# Altium schematic symbol library jlcpcb_2025_04_capacitors_extended_1206.schlib: 2503 symbols (part 12 of 14) (continued)
## LMK316ABJ226KL-T
designator C?  Capacitance: 22uF  (hidden comment: *)
Capacitor, Ceramic (MLCC), 22uF, ±10%, 10V, X5R, ±10%, SMD 1206; Manufacturer: Taiyo Yuden; Manufacturer Part Number: LMK316ABJ226KL-T; Package Size: 1206; JLCPCB Basic Part: No; JLCPCB Part Number: C412630; Supplier 1: LCSC; Category: Capacitors - MLCC; Supplier Part Number 1: C412630; Tolerance: ±10%; Voltage Rating: 10V; Temperature Coefficient: X5R; RoHS: Yes; ComponentLink1Description: Datasheet; ComponentLink1URL: https://wmsc.lcsc.com/wmsc/upload/file/pdf/v2/lcsc/2211282230_Taiyo-Yuden-LMK316ABJ226KL-T_C412630.pdf; ComponentLink2Description: JLCPCB Part URL; ComponentLink2URL: https://jlcpcb.com/partdetail/C412630; ComponentLink3Description: LCSC Part URL; ComponentLink3URL: https://lcsc.com/product-detail/Multilayer-Ceramic-Capacitors-MLCC---SMD-SMT_Taiyo-Yuden-Taiyo-Yuden-LMK316ABJ226KL-T_C412630.html
footprint CAP-1206 (1206 (3216M) Capacitor)
pins: 1, 2

## LMK316ABJ226KLHT
designator C?  Capacitance: 22uF  (hidden comment: *)
Capacitor, Ceramic (MLCC), 22uF, ±10%, 10V, X5R, ±10%, SMD 1206; Manufacturer: Taiyo Yuden; Manufacturer Part Number: LMK316ABJ226KLHT; Package Size: 1206; JLCPCB Basic Part: No; JLCPCB Part Number: C650976; Supplier 1: LCSC; Category: Capacitors - MLCC; Supplier Part Number 1: C650976; Tolerance: ±10%; Voltage Rating: 10V; Temperature Coefficient: X5R; RoHS: Yes; ComponentLink1Description: Datasheet; ComponentLink1URL: https://wmsc.lcsc.com/wmsc/upload/file/pdf/v2/lcsc/2211282200_Taiyo-Yuden-LMK316ABJ226KLHT_C650976.pdf; ComponentLink2Description: JLCPCB Part URL; ComponentLink2URL: https://jlcpcb.com/partdetail/C650976; ComponentLink3Description: LCSC Part URL; ComponentLink3URL: https://lcsc.com/product-detail/Multilayer-Ceramic-Capacitors-MLCC---SMD-SMT_Taiyo-Yuden-Taiyo-Yuden-LMK316ABJ226KLHT_C650976.html
footprint CAP-1206 (1206 (3216M) Capacitor)
pins: 1, 2

## LMK316ABJ226MLHT
designator C?  Capacitance: 22uF  (hidden comment: *)
Capacitor, Ceramic (MLCC), 22uF, ±20%, 10V, X5R, ±20%, SMD 1206; Manufacturer: Taiyo Yuden; Manufacturer Part Number: LMK316ABJ226MLHT; Package Size: 1206; JLCPCB Basic Part: No; JLCPCB Part Number: C651003; Supplier 1: LCSC; Category: Capacitors - MLCC; Supplier Part Number 1: C651003; Tolerance: ±20%; Voltage Rating: 10V; Temperature Coefficient: X5R; RoHS: Yes; ComponentLink1Description: Datasheet; ComponentLink1URL: https://wmsc.lcsc.com/wmsc/upload/file/pdf/v2/lcsc/2304140030_Taiyo-Yuden-LMK316ABJ226MLHT_C651003.pdf; ComponentLink2Description: JLCPCB Part URL; ComponentLink2URL: https://jlcpcb.com/partdetail/C651003; ComponentLink3Description: LCSC Part URL; ComponentLink3URL: https://lcsc.com/product-detail/Multilayer-Ceramic-Capacitors-MLCC---SMD-SMT_Taiyo-Yuden-Taiyo-Yuden-LMK316ABJ226MLHT_C651003.html
footprint CAP-1206 (1206 (3216M) Capacitor)
pins: 1, 2

## LMK316ABJ476ML-T
designator C?  Capacitance: 47uF  (hidden comment: *)
Capacitor, Ceramic (MLCC), 47uF, ±20%, 10V, X5R, ±20%, SMD 1206; Manufacturer: Taiyo Yuden; Manufacturer Part Number: LMK316ABJ476ML-T; Package Size: 1206; JLCPCB Basic Part: No; JLCPCB Part Number: C268024; Supplier 1: LCSC; Category: Capacitors - MLCC; Supplier Part Number 1: C268024; Tolerance: ±20%; Voltage Rating: 10V; Temperature Coefficient: X5R; RoHS: Yes; ComponentLink1Description: Datasheet; ComponentLink1URL: https://wmsc.lcsc.com/wmsc/upload/file/pdf/v2/lcsc/2211282230_Taiyo-Yuden-LMK316ABJ476ML-T_C268024.pdf; ComponentLink2Description: JLCPCB Part URL; ComponentLink2URL: https://jlcpcb.com/partdetail/C268024; ComponentLink3Description: LCSC Part URL; ComponentLink3URL: https://lcsc.com/product-detail/Multilayer-Ceramic-Capacitors-MLCC---SMD-SMT_Taiyo-Yuden-Taiyo-Yuden-LMK316ABJ476ML-T_C268024.html
footprint CAP-1206 (1206 (3216M) Capacitor)
pins: 1, 2

## LMK316B7226KL-TR
designator C?  Capacitance: 22uF  (hidden comment: *)
Capacitor, Ceramic (MLCC), 22uF, ±10%, 10V, X7R, ±10%, SMD 1206; Manufacturer: Taiyo Yuden; Manufacturer Part Number: LMK316B7226KL-TR; Package Size: 1206; JLCPCB Basic Part: No; JLCPCB Part Number: C555367; Supplier 1: LCSC; Category: Capacitors - MLCC; Supplier Part Number 1: C555367; Tolerance: ±10%; Voltage Rating: 10V; Temperature Coefficient: X7R; RoHS: Yes; ComponentLink1Description: Datasheet; ComponentLink1URL: https://wmsc.lcsc.com/wmsc/upload/file/pdf/v2/lcsc/2304140030_Taiyo-Yuden-LMK316B7226KL-TR_C555367.pdf; ComponentLink2Description: JLCPCB Part URL; ComponentLink2URL: https://jlcpcb.com/partdetail/C555367; ComponentLink3Description: LCSC Part URL; ComponentLink3URL: https://lcsc.com/product-detail/Multilayer-Ceramic-Capacitors-MLCC---SMD-SMT_Taiyo-Yuden-Taiyo-Yuden-LMK316B7226KL-TR_C555367.html
footprint CAP-1206 (1206 (3216M) Capacitor)
pins: 1, 2

## LMK316B7475KL-T
designator C?  Capacitance: 4.7uF  (hidden comment: *)
Capacitor, Ceramic (MLCC), 4.7uF, ±10%, 10V, X7R, ±10%, SMD 1206; Manufacturer: Taiyo Yuden; Manufacturer Part Number: LMK316B7475KL-T; Package Size: 1206; JLCPCB Basic Part: No; JLCPCB Part Number: C311694; Supplier 1: LCSC; Category: Capacitors - MLCC; Supplier Part Number 1: C311694; Tolerance: ±10%; Voltage Rating: 10V; Temperature Coefficient: X7R; RoHS: Yes; ComponentLink1Description: Datasheet; ComponentLink1URL: https://wmsc.lcsc.com/wmsc/upload/file/pdf/v2/lcsc/2211282230_Taiyo-Yuden-LMK316B7475KL-T_C311694.pdf; ComponentLink2Description: JLCPCB Part URL; ComponentLink2URL: https://jlcpcb.com/partdetail/C311694; ComponentLink3Description: LCSC Part URL; ComponentLink3URL: https://lcsc.com/product-detail/Multilayer-Ceramic-Capacitors-MLCC---SMD-SMT_Taiyo-Yuden-Taiyo-Yuden-LMK316B7475KL-T_C311694.html
footprint CAP-1206 (1206 (3216M) Capacitor)
pins: 1, 2

## LMK316BC6476ML-T
designator C?  Capacitance: 47uF  (hidden comment: *)
Capacitor, Ceramic (MLCC), 47uF, ±20%, 10V, X6S, ±20%, SMD 1206; Manufacturer: Taiyo Yuden; Manufacturer Part Number: LMK316BC6476ML-T; Package Size: 1206; JLCPCB Basic Part: No; JLCPCB Part Number: C2176999; Supplier 1: LCSC; Category: Capacitors - MLCC; Supplier Part Number 1: C2176999; Tolerance: ±20%; Voltage Rating: 10V; Temperature Coefficient: X6S; RoHS: Yes; ComponentLink1Description: Datasheet; ComponentLink1URL: https://wmsc.lcsc.com/wmsc/upload/file/pdf/v2/lcsc/2309051423_Taiyo-Yuden-LMK316BC6476ML-T_C2176999.pdf; ComponentLink2Description: JLCPCB Part URL; ComponentLink2URL: https://jlcpcb.com/partdetail/C2176999; ComponentLink3Description: LCSC Part URL; ComponentLink3URL: https://lcsc.com/product-detail/Multilayer-Ceramic-Capacitors-MLCC---SMD-SMT_Taiyo-Yuden-Taiyo-Yuden-LMK316BC6476ML-T_C2176999.html
footprint CAP-1206 (1206 (3216M) Capacitor)
pins: 1, 2

## LMK316BJ226KL-T
designator C?  Capacitance: 22uF  (hidden comment: *)
Capacitor, Ceramic (MLCC), 22uF, ±10%, 10V, X5R, ±10%, SMD 1206; Manufacturer: Taiyo Yuden; Manufacturer Part Number: LMK316BJ226KL-T; Package Size: 1206; JLCPCB Basic Part: No; JLCPCB Part Number: C92818; Supplier 1: LCSC; Category: Capacitors - MLCC; Supplier Part Number 1: C92818; Tolerance: ±10%; Voltage Rating: 10V; Temperature Coefficient: X5R; RoHS: Yes; ComponentLink1Description: Datasheet; ComponentLink1URL: https://wmsc.lcsc.com/wmsc/upload/file/pdf/v2/lcsc/2211282300_Taiyo-Yuden-LMK316BJ226KL-T_C92818.pdf; ComponentLink2Description: JLCPCB Part URL; ComponentLink2URL: https://jlcpcb.com/partdetail/C92818; ComponentLink3Description: LCSC Part URL; ComponentLink3URL: https://lcsc.com/product-detail/Multilayer-Ceramic-Capacitors-MLCC---SMD-SMT_Taiyo-Yuden-Taiyo-Yuden-LMK316BJ226KL-T_C92818.html
footprint CAP-1206 (1206 (3216M) Capacitor)
pins: 1, 2

## LMK316BJ226ML-T
designator C?  Capacitance: 22uF  (hidden comment: *)
Capacitor, Ceramic (MLCC), 22uF, ±20%, 10V, X5R, ±20%, SMD 1206; Manufacturer: Taiyo Yuden; Manufacturer Part Number: LMK316BJ226ML-T; Package Size: 1206; JLCPCB Basic Part: No; JLCPCB Part Number: C92819; Supplier 1: LCSC; Category: Capacitors - MLCC; Supplier Part Number 1: C92819; Tolerance: ±20%; Voltage Rating: 10V; Temperature Coefficient: X5R; RoHS: Yes; ComponentLink1Description: Datasheet; ComponentLink1URL: https://wmsc.lcsc.com/wmsc/upload/file/pdf/v2/lcsc/1912111437_Taiyo-Yuden-LMK316BJ226ML-T_C92819.pdf; ComponentLink2Description: JLCPCB Part URL; ComponentLink2URL: https://jlcpcb.com/partdetail/C92819; ComponentLink3Description: LCSC Part URL; ComponentLink3URL: https://lcsc.com/product-detail/Multilayer-Ceramic-Capacitors-MLCC---SMD-SMT_Taiyo-Yuden-Taiyo-Yuden-LMK316BJ226ML-T_C92819.html
footprint CAP-1206 (1206 (3216M) Capacitor)
pins: 1, 2

## LMK316BJ475KL-T
designator C?  Capacitance: 4.7uF  (hidden comment: *)
Capacitor, Ceramic (MLCC), 4.7uF, ±10%, 10V, X5R, ±10%, SMD 1206; Manufacturer: Taiyo Yuden; Manufacturer Part Number: LMK316BJ475KL-T; Package Size: 1206; JLCPCB Basic Part: No; JLCPCB Part Number: C89145; Supplier 1: LCSC; Category: Capacitors - MLCC; Supplier Part Number 1: C89145; Tolerance: ±10%; Voltage Rating: 10V; Temperature Coefficient: X5R; RoHS: Yes; ComponentLink1Description: Datasheet; ComponentLink1URL: https://wmsc.lcsc.com/wmsc/upload/file/pdf/v2/lcsc/2211282300_Taiyo-Yuden-LMK316BJ475KL-T_C89145.pdf; ComponentLink2Description: JLCPCB Part URL; ComponentLink2URL: https://jlcpcb.com/partdetail/C89145; ComponentLink3Description: LCSC Part URL; ComponentLink3URL: https://lcsc.com/product-detail/Multilayer-Ceramic-Capacitors-MLCC---SMD-SMT_Taiyo-Yuden-Taiyo-Yuden-LMK316BJ475KL-T_C89145.html
footprint CAP-1206 (1206 (3216M) Capacitor)
pins: 1, 2

## LMK316BJ475ML-T
designator C?  Capacitance: 4.7uF  (hidden comment: *)
Capacitor, Ceramic (MLCC), 4.7uF, ±20%, 10V, X5R, ±20%, SMD 1206; Manufacturer: Taiyo Yuden; Manufacturer Part Number: LMK316BJ475ML-T; Package Size: 1206; JLCPCB Basic Part: No; JLCPCB Part Number: C92820; Supplier 1: LCSC; Category: Capacitors - MLCC; Supplier Part Number 1: C92820; Tolerance: ±20%; Voltage Rating: 10V; Temperature Coefficient: X5R; RoHS: Yes; ComponentLink1Description: Datasheet; ComponentLink1URL: https://wmsc.lcsc.com/wmsc/upload/file/pdf/v2/lcsc/2211282300_Taiyo-Yuden-LMK316BJ475ML-T_C92820.pdf; ComponentLink2Description: JLCPCB Part URL; ComponentLink2URL: https://jlcpcb.com/partdetail/C92820; ComponentLink3Description: LCSC Part URL; ComponentLink3URL: https://lcsc.com/product-detail/Multilayer-Ceramic-Capacitors-MLCC---SMD-SMT_Taiyo-Yuden-Taiyo-Yuden-LMK316BJ475ML-T_C92820.html
footprint CAP-1206 (1206 (3216M) Capacitor)
pins: 1, 2

## LMK316BJ476ML-T
designator C?  Capacitance: 47uF  (hidden comment: *)
Capacitor, Ceramic (MLCC), 47uF, ±20%, 10V, X5R, ±20%, SMD 1206; Manufacturer: Taiyo Yuden; Manufacturer Part Number: LMK316BJ476ML-T; Package Size: 1206; JLCPCB Basic Part: No; JLCPCB Part Number: C92821; Supplier 1: LCSC; Category: Capacitors - MLCC; Supplier Part Number 1: C92821; Tolerance: ±20%; Voltage Rating: 10V; Temperature Coefficient: X5R; RoHS: Yes; ComponentLink1Description: Datasheet; ComponentLink1URL: https://wmsc.lcsc.com/wmsc/upload/file/pdf/v2/lcsc/2211282300_Taiyo-Yuden-LMK316BJ476ML-T_C92821.pdf; ComponentLink2Description: JLCPCB Part URL; ComponentLink2URL: https://jlcpcb.com/partdetail/C92821; ComponentLink3Description: LCSC Part URL; ComponentLink3URL: https://lcsc.com/product-detail/Multilayer-Ceramic-Capacitors-MLCC---SMD-SMT_Taiyo-Yuden-Taiyo-Yuden-LMK316BJ476ML-T_C92821.html
footprint CAP-1206 (1206 (3216M) Capacitor)
pins: 1, 2

## MBK1206X7R102K202NT
designator C?  Capacitance: 1nF  (hidden comment: *)
Capacitor, Ceramic (MLCC), 1nF, 2kV, SMD 1206; Manufacturer: FH-BK(Guangdong Fenghua Bangke Elec); Manufacturer Part Number: MBK1206X7R102K202NT; Package Size: 1206; JLCPCB Basic Part: No; JLCPCB Part Number: C2830714; Supplier 1: LCSC; Category: Capacitors - MLCC; Supplier Part Number 1: C2830714; Voltage Rating: 2kV; RoHS: Yes; ComponentLink1Description: Datasheet; ComponentLink2Description: JLCPCB Part URL; ComponentLink2URL: https://jlcpcb.com/partdetail/C2830714; ComponentLink3Description: LCSC Part URL; ComponentLink3URL: https://lcsc.com/product-detail/Multilayer-Ceramic-Capacitors-MLCC---SMD-SMT_FH-BKGuangdong-Fenghua-Bangke-Elec-FH-BKGuangdong-Fenghua-Bangke-Elec-1206B102K202NT_C2830714.html
footprint CAP-1206 (1206 (3216M) Capacitor)
pins: 1, 2

## MCAST31LAB7106KTNA01
designator C?  Capacitance: 10uF  (hidden comment: *)
Capacitor, Ceramic (MLCC), 10uF, ±10%, 25V, X7R, ±10%, SMD 1206; Manufacturer: Taiyo Yuden; Manufacturer Part Number: MCAST31LAB7106KTNA01; Package Size: 1206; JLCPCB Basic Part: No; JLCPCB Part Number: C386089; Supplier 1: LCSC; Category: Capacitors - MLCC; Supplier Part Number 1: C386089; Tolerance: ±10%; Voltage Rating: 25V; Temperature Coefficient: X7R; RoHS: Yes; ComponentLink1Description: Datasheet; ComponentLink1URL: https://wmsc.lcsc.com/wmsc/upload/file/pdf/v2/lcsc/2308231123_Taiyo-Yuden-MCAST31LAB7106KTNA01_C386089.pdf; ComponentLink2Description: JLCPCB Part URL; ComponentLink2URL: https://jlcpcb.com/partdetail/C386089; ComponentLink3Description: LCSC Part URL; ComponentLink3URL: https://lcsc.com/product-detail/Multilayer-Ceramic-Capacitors-MLCC---SMD-SMT_Taiyo-Yuden-Taiyo-Yuden-TMK316AB7106KLHT_C386089.html
footprint CAP-1206 (1206 (3216M) Capacitor)
pins: 1, 2

## MCJCG31LBB7106KTPA01
designator C?  Capacitance: 10uF  (hidden comment: *)
Capacitor, Ceramic (MLCC), 10uF, ±10%, 35V, X7R, ±10%, SMD 1206; Manufacturer: Taiyo Yuden; Manufacturer Part Number: MCJCG31LBB7106KTPA01; Package Size: 1206; JLCPCB Basic Part: No; JLCPCB Part Number: C5767734; Supplier 1: LCSC; Category: Capacitors - MLCC; Supplier Part Number 1: C5767734; Tolerance: ±10%; Voltage Rating: 35V; Temperature Coefficient: X7R; RoHS: Yes; ComponentLink1Description: Datasheet; ComponentLink1URL: https://wmsc.lcsc.com/wmsc/upload/file/pdf/v2/lcsc/2401302210_Taiyo-Yuden-MCJCG31LBB7106KTPA01_C5767734.pdf; ComponentLink2Description: JLCPCB Part URL; ComponentLink2URL: https://jlcpcb.com/partdetail/C5767734; ComponentLink3Description: LCSC Part URL; ComponentLink3URL: https://lcsc.com/product-detail/Multilayer-Ceramic-Capacitors-MLCC---SMD-SMT_Taiyo-Yuden-Taiyo-Yuden-MCJCG31LBB7106KTPA01_C5767734.html
footprint CAP-1206 (1206 (3216M) Capacitor)
pins: 1, 2

## MSASU31LBB5106KTNA01
designator C?  Capacitance: 10uF  (hidden comment: *)
Capacitor, Ceramic (MLCC), 10uF, ±10%, 50V, X5R, ±10%, SMD 1206; Manufacturer: Taiyo Yuden; Manufacturer Part Number: MSASU31LBB5106KTNA01; Package Size: 1206; JLCPCB Basic Part: No; JLCPCB Part Number: C105175; Supplier 1: LCSC; Category: Capacitors - MLCC; Supplier Part Number 1: C105175; Tolerance: ±10%; Voltage Rating: 50V; Temperature Coefficient: X5R; RoHS: Yes; ComponentLink1Description: Datasheet; ComponentLink1URL: https://wmsc.lcsc.com/wmsc/upload/file/pdf/v2/lcsc/2307141635_Taiyo-Yuden-MSASU31LBB5106KTNA01_C105175.pdf; ComponentLink2Description: JLCPCB Part URL; ComponentLink2URL: https://jlcpcb.com/partdetail/C105175; ComponentLink3Description: LCSC Part URL; ComponentLink3URL: https://lcsc.com/product-detail/Multilayer-Ceramic-Capacitors-MLCC---SMD-SMT_Taiyo-Yuden-Taiyo-Yuden-UMK316BBJ106KL-T_C105175.html
footprint CAP-1206 (1206 (3216M) Capacitor)
pins: 1, 2

## MT31N102J500CT
designator C?  Capacitance: 1nF  (hidden comment: *)
Capacitor, Ceramic (MLCC), 1nF, ±5%, 50V, NP0, ±5%, SMD 1206; Manufacturer: Walsin Tech Corp; Manufacturer Part Number: MT31N102J500CT; Package Size: 1206; JLCPCB Basic Part: No; JLCPCB Part Number: C470045; Supplier 1: LCSC; Category: Capacitors - MLCC; Supplier Part Number 1: C470045; Tolerance: ±5%; Voltage Rating: 50V; Temperature Coefficient: NP0; RoHS: Yes; ComponentLink1Description: Datasheet; ComponentLink1URL: https://wmsc.lcsc.com/wmsc/upload/file/pdf/v2/lcsc/2304140030_Walsin-Tech-Corp-MT31N102J500CT_C470045.pdf; ComponentLink2Description: JLCPCB Part URL; ComponentLink2URL: https://jlcpcb.com/partdetail/C470045; ComponentLink3Description: LCSC Part URL; ComponentLink3URL: https://lcsc.com/product-detail/Multilayer-Ceramic-Capacitors-MLCC---SMD-SMT_Walsin-Tech-Corp-Walsin-Tech-Corp-MT31N102J500CT_C470045.html
footprint CAP-1206 (1206 (3216M) Capacitor)
pins: 1, 2

## NC1206B105K101CEGN
designator C?  Capacitance: 1uF  (hidden comment: *)
Capacitor, Ceramic (MLCC), 1uF, 100V, SMD 1206; Manufacturer: HUI JU; Manufacturer Part Number: NC1206B105K101CEGN; Package Size: 1206; JLCPCB Basic Part: No; JLCPCB Part Number: C2832656; Supplier 1: LCSC; Category: Capacitors - MLCC; Supplier Part Number 1: C2832656; Voltage Rating: 100V; RoHS: Yes; ComponentLink1Description: Datasheet; ComponentLink1URL: https://wmsc.lcsc.com/wmsc/upload/file/pdf/v2/lcsc/2105241448_HUI-JU-NC1206B105K101CEGN_C2832656.pdf; ComponentLink2Description: JLCPCB Part URL; ComponentLink2URL: https://jlcpcb.com/partdetail/C2832656; ComponentLink3Description: LCSC Part URL; ComponentLink3URL: https://lcsc.com/product-detail/Multilayer-Ceramic-Capacitors-MLCC---SMD-SMT_HUI-JU-HUI-JU-NC1206B105K101CEGN_C2832656.html
footprint CAP-1206 (1206 (3216M) Capacitor)
pins: 1, 2

## NC1206B105K500CEGN
designator C?  Capacitance: 1uF  (hidden comment: *)
Capacitor, Ceramic (MLCC), 1uF, ±10%, 50V, X7R, ±10%, SMD 1206; Manufacturer: HUI JU; Manufacturer Part Number: NC1206B105K500CEGN; Package Size: 1206; JLCPCB Basic Part: No; JLCPCB Part Number: C2843480; Supplier 1: LCSC; Category: Capacitors - MLCC; Supplier Part Number 1: C2843480; Tolerance: ±10%; Voltage Rating: 50V; Temperature Coefficient: X7R; RoHS: Yes; ComponentLink1Description: Datasheet; ComponentLink1URL: https://wmsc.lcsc.com/wmsc/upload/file/pdf/v2/lcsc/2201141700_HUI-JU-NC1206B105K500CEGN_C2843480.pdf; ComponentLink2Description: JLCPCB Part URL; ComponentLink2URL: https://jlcpcb.com/partdetail/C2843480; ComponentLink3Description: LCSC Part URL; ComponentLink3URL: https://lcsc.com/product-detail/Multilayer-Ceramic-Capacitors-MLCC---SMD-SMT_HUI-JU-HUI-JU-NC1206B105K500CEGN_C2843480.html
footprint CAP-1206 (1206 (3216M) Capacitor)
pins: 1, 2

## NC1206B105M101CEGN
designator C?  Capacitance: 1uF  (hidden comment: *)
Capacitor, Ceramic (MLCC), 1uF, ±20%, 100V, X7R, ±20%, SMD 1206; Manufacturer: HUI JU; Manufacturer Part Number: NC1206B105M101CEGN; Package Size: 1206; JLCPCB Basic Part: No; JLCPCB Part Number: C2961023; Supplier 1: LCSC; Category: Capacitors - MLCC; Supplier Part Number 1: C2961023; Tolerance: ±20%; Voltage Rating: 100V; Temperature Coefficient: X7R; RoHS: Yes; ComponentLink1Description: Datasheet; ComponentLink1URL: https://wmsc.lcsc.com/wmsc/upload/file/pdf/v2/lcsc/2201141700_HUI-JU-NC1206B105M101CEGN_C2961023.pdf; ComponentLink2Description: JLCPCB Part URL; ComponentLink2URL: https://jlcpcb.com/partdetail/C2961023; ComponentLink3Description: LCSC Part URL; ComponentLink3URL: https://lcsc.com/product-detail/Multilayer-Ceramic-Capacitors-MLCC---SMD-SMT_HUI-JU-HUI-JU-NC1206B105M101CEGN_C2961023.html
footprint CAP-1206 (1206 (3216M) Capacitor)
pins: 1, 2

## NC1206B105M500CEPN
designator C?  Capacitance: 1uF  (hidden comment: *)
Capacitor, Ceramic (MLCC), 1uF, ±20%, 50V, ±20%, SMD 1206; Manufacturer: HUI JU; Manufacturer Part Number: NC1206B105M500CEPN; Package Size: 1206; JLCPCB Basic Part: No; JLCPCB Part Number: C883444; Supplier 1: LCSC; Category: Capacitors - MLCC; Supplier Part Number 1: C883444; Tolerance: ±20%; Voltage Rating: 50V; RoHS: Yes; ComponentLink1Description: Datasheet; ComponentLink1URL: https://wmsc.lcsc.com/wmsc/upload/file/pdf/v2/lcsc/2304140030_HUI-JU-NC1206B105M500CEPN_C883444.pdf; ComponentLink2Description: JLCPCB Part URL; ComponentLink2URL: https://jlcpcb.com/partdetail/C883444; ComponentLink3Description: LCSC Part URL; ComponentLink3URL: https://lcsc.com/product-detail/Multilayer-Ceramic-Capacitors-MLCC---SMD-SMT_HUI-JU-HUI-JU-NC1206B105M500CEPN_C883444.html
footprint CAP-1206 (1206 (3216M) Capacitor)
pins: 1, 2

## ND1206B104K251CEDN
designator C?  Capacitance: 100nF  (hidden comment: *)
Capacitor, Ceramic (MLCC), 100nF, 250V, X7R, SMD 1206; Manufacturer: HUI JU; Manufacturer Part Number: ND1206B104K251CEDN; Package Size: 1206; JLCPCB Basic Part: No; JLCPCB Part Number: C2843478; Supplier 1: LCSC; Category: Capacitors - MLCC; Supplier Part Number 1: C2843478; Voltage Rating: 250V; Temperature Coefficient: X7R; RoHS: Yes; ComponentLink1Description: Datasheet; ComponentLink1URL: https://wmsc.lcsc.com/wmsc/upload/file/pdf/v2/lcsc/2201201730_HUI-JU-ND1206B104K251CEDN_C2843478.pdf; ComponentLink2Description: JLCPCB Part URL; ComponentLink2URL: https://jlcpcb.com/partdetail/C2843478; ComponentLink3Description: LCSC Part URL; ComponentLink3URL: https://lcsc.com/product-detail/Multilayer-Ceramic-Capacitors-MLCC---SMD-SMT_HUI-JU-HUI-JU-ND1206B104K251CEDN_C2843478.html
footprint CAP-1206 (1206 (3216M) Capacitor)
pins: 1, 2

## ND1206B473K251CEGN
designator C?  Capacitance: 47nF  (hidden comment: *)
Capacitor, Ceramic (MLCC), 47nF, 250V, X7R, SMD 1206; Manufacturer: HUI JU; Manufacturer Part Number: ND1206B473K251CEGN; Package Size: 1206; JLCPCB Basic Part: No; JLCPCB Part Number: C2958819; Supplier 1: LCSC; Category: Capacitors - MLCC; Supplier Part Number 1: C2958819; Voltage Rating: 250V; Temperature Coefficient: X7R; RoHS: Yes; ComponentLink1Description: Datasheet; ComponentLink1URL: https://wmsc.lcsc.com/wmsc/upload/file/pdf/v2/lcsc/2201201730_HUI-JU-ND1206B473K251CEGN_C2958819.pdf; ComponentLink2Description: JLCPCB Part URL; ComponentLink2URL: https://jlcpcb.com/partdetail/C2958819; ComponentLink3Description: LCSC Part URL; ComponentLink3URL: https://lcsc.com/product-detail/Multilayer-Ceramic-Capacitors-MLCC---SMD-SMT_HUI-JU-HUI-JU-ND1206B473K251CEGN_C2958819.html
footprint CAP-1206 (1206 (3216M) Capacitor)
pins: 1, 2

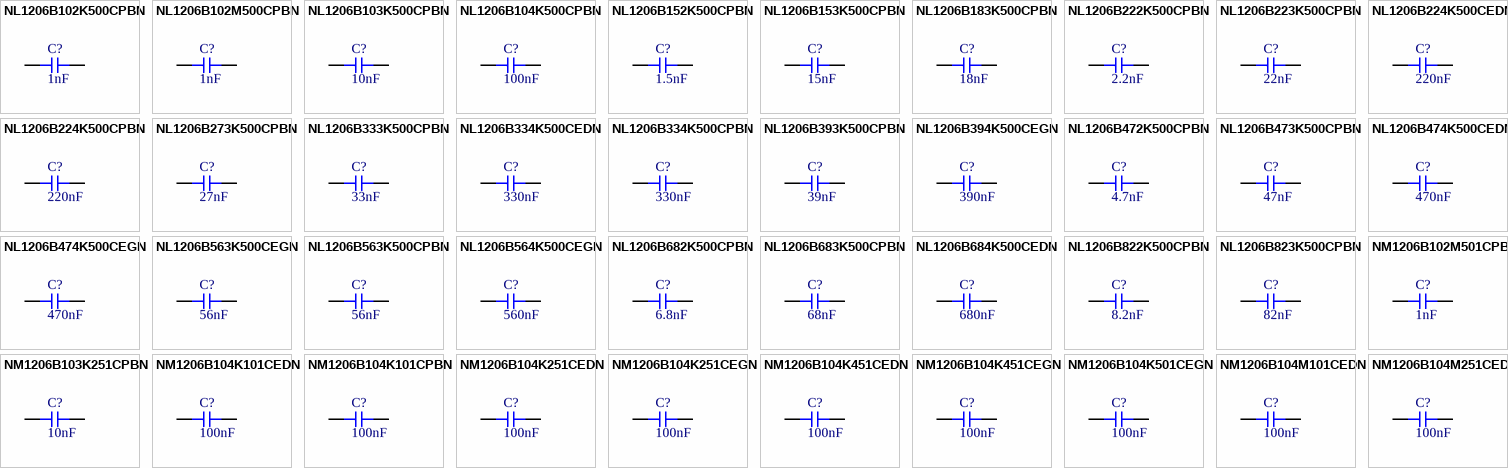
[diagram p53: symbols NL1206B102K500CPBN to NM1206B104M251CEDN]

## NL1206B102K500CPBN
designator C?  Capacitance: 1nF  (hidden comment: *)
Capacitor, Ceramic (MLCC), 1nF, ±10%, 50V, ±10%, SMD 1206; Manufacturer: HUI JU; Manufacturer Part Number: NL1206B102K500CPBN; Package Size: 1206; JLCPCB Basic Part: No; JLCPCB Part Number: C784421; Supplier 1: LCSC; Category: Capacitors - MLCC; Supplier Part Number 1: C784421; Tolerance: ±10%; Voltage Rating: 50V; RoHS: Yes; ComponentLink1Description: Datasheet; ComponentLink1URL: https://wmsc.lcsc.com/wmsc/upload/file/pdf/v2/lcsc/2304140030_HUI-JU-NL1206B102K500CPBN_C784421.pdf; ComponentLink2Description: JLCPCB Part URL; ComponentLink2URL: https://jlcpcb.com/partdetail/C784421; ComponentLink3Description: LCSC Part URL; ComponentLink3URL: https://lcsc.com/product-detail/Multilayer-Ceramic-Capacitors-MLCC---SMD-SMT_HUI-JU-HUI-JU-NL1206B102K500CPBN_C784421.html
footprint CAP-1206 (1206 (3216M) Capacitor)
pins: 1, 2

## NL1206B102M500CPBN
designator C?  Capacitance: 1nF  (hidden comment: *)
Capacitor, Ceramic (MLCC), 1nF, ±20%, 50V, X7R, ±20%, SMD 1206; Manufacturer: HUI JU; Manufacturer Part Number: NL1206B102M500CPBN; Package Size: 1206; JLCPCB Basic Part: No; JLCPCB Part Number: C840119; Supplier 1: LCSC; Category: Capacitors - MLCC; Supplier Part Number 1: C840119; Tolerance: ±20%; Voltage Rating: 50V; Temperature Coefficient: X7R; RoHS: Yes; ComponentLink1Description: Datasheet; ComponentLink1URL: https://wmsc.lcsc.com/wmsc/upload/file/pdf/v2/lcsc/2304140030_HUI-JU-NL1206B102M500CPBN_C840119.pdf; ComponentLink2Description: JLCPCB Part URL; ComponentLink2URL: https://jlcpcb.com/partdetail/C840119; ComponentLink3Description: LCSC Part URL; ComponentLink3URL: https://lcsc.com/product-detail/Multilayer-Ceramic-Capacitors-MLCC---SMD-SMT_HUI-JU-HUI-JU-NL1206B102M500CPBN_C840119.html
footprint CAP-1206 (1206 (3216M) Capacitor)
pins: 1, 2

## NL1206B103K500CPBN
designator C?  Capacitance: 10nF  (hidden comment: *)
Capacitor, Ceramic (MLCC), 10nF, ±10%, 50V, ±10%, SMD 1206; Manufacturer: HUI JU; Manufacturer Part Number: NL1206B103K500CPBN; Package Size: 1206; JLCPCB Basic Part: No; JLCPCB Part Number: C841553; Supplier 1: LCSC; Category: Capacitors - MLCC; Supplier Part Number 1: C841553; Tolerance: ±10%; Voltage Rating: 50V; RoHS: Yes; ComponentLink1Description: Datasheet; ComponentLink1URL: https://wmsc.lcsc.com/wmsc/upload/file/pdf/v2/lcsc/2304140030_HUI-JU-NL1206B103K500CPBN_C841553.pdf; ComponentLink2Description: JLCPCB Part URL; ComponentLink2URL: https://jlcpcb.com/partdetail/C841553; ComponentLink3Description: LCSC Part URL; ComponentLink3URL: https://lcsc.com/product-detail/Multilayer-Ceramic-Capacitors-MLCC---SMD-SMT_HUI-JU-HUI-JU-NL1206B103K500CPBN_C841553.html
footprint CAP-1206 (1206 (3216M) Capacitor)
pins: 1, 2

## NL1206B104K500CPBN
designator C?  Capacitance: 100nF  (hidden comment: *)
Capacitor, Ceramic (MLCC), 100nF, ±10%, 50V, ±10%, SMD 1206; Manufacturer: HUI JU; Manufacturer Part Number: NL1206B104K500CPBN; Package Size: 1206; JLCPCB Basic Part: No; JLCPCB Part Number: C841554; Supplier 1: LCSC; Category: Capacitors - MLCC; Supplier Part Number 1: C841554; Tolerance: ±10%; Voltage Rating: 50V; RoHS: Yes; ComponentLink1Description: Datasheet; ComponentLink1URL: https://wmsc.lcsc.com/wmsc/upload/file/pdf/v2/lcsc/2304140030_HUI-JU-NL1206B104K500CPBN_C841554.pdf; ComponentLink2Description: JLCPCB Part URL; ComponentLink2URL: https://jlcpcb.com/partdetail/C841554; ComponentLink3Description: LCSC Part URL; ComponentLink3URL: https://lcsc.com/product-detail/Multilayer-Ceramic-Capacitors-MLCC---SMD-SMT_HUI-JU-HUI-JU-NL1206B104K500CPBN_C841554.html
footprint CAP-1206 (1206 (3216M) Capacitor)
pins: 1, 2

## NL1206B152K500CPBN
designator C?  Capacitance: 1.5nF  (hidden comment: *)
Capacitor, Ceramic (MLCC), 1.5nF, ±10%, 50V, X7R, ±10%, SMD 1206; Manufacturer: HUI JU; Manufacturer Part Number: NL1206B152K500CPBN; Package Size: 1206; JLCPCB Basic Part: No; JLCPCB Part Number: C2843481; Supplier 1: LCSC; Category: Capacitors - MLCC; Supplier Part Number 1: C2843481; Tolerance: ±10%; Voltage Rating: 50V; Temperature Coefficient: X7R; RoHS: Yes; ComponentLink1Description: Datasheet; ComponentLink1URL: https://wmsc.lcsc.com/wmsc/upload/file/pdf/v2/lcsc/2201141700_HUI-JU-NL1206B152K500CPBN_C2843481.pdf; ComponentLink2Description: JLCPCB Part URL; ComponentLink2URL: https://jlcpcb.com/partdetail/C2843481; ComponentLink3Description: LCSC Part URL; ComponentLink3URL: https://lcsc.com/product-detail/Multilayer-Ceramic-Capacitors-MLCC---SMD-SMT_HUI-JU-HUI-JU-NL1206B152K500CPBN_C2843481.html
footprint CAP-1206 (1206 (3216M) Capacitor)
pins: 1, 2

## NL1206B153K500CPBN
designator C?  Capacitance: 15nF  (hidden comment: *)
Capacitor, Ceramic (MLCC), 15nF, ±10%, 50V, ±10%, SMD 1206; Manufacturer: HUI JU; Manufacturer Part Number: NL1206B153K500CPBN; Package Size: 1206; JLCPCB Basic Part: No; JLCPCB Part Number: C2760357; Supplier 1: LCSC; Category: Capacitors - MLCC; Supplier Part Number 1: C2760357; Tolerance: ±10%; Voltage Rating: 50V; RoHS: Yes; ComponentLink1Description: Datasheet; ComponentLink1URL: https://wmsc.lcsc.com/wmsc/upload/file/pdf/v2/lcsc/2106062203_HUI-JU-NL1206B153K500CPBN_C2760357.pdf; ComponentLink2Description: JLCPCB Part URL; ComponentLink2URL: https://jlcpcb.com/partdetail/C2760357; ComponentLink3Description: LCSC Part URL; ComponentLink3URL: https://lcsc.com/product-detail/Multilayer-Ceramic-Capacitors-MLCC---SMD-SMT_HUI-JU-HUI-JU-NL1206B153K500CPBN_C2760357.html
footprint CAP-1206 (1206 (3216M) Capacitor)
pins: 1, 2

## NL1206B183K500CPBN
designator C?  Capacitance: 18nF  (hidden comment: *)
Capacitor, Ceramic (MLCC), 18nF, 50V, SMD 1206; Manufacturer: HUI JU; Manufacturer Part Number: NL1206B183K500CPBN; Package Size: 1206; JLCPCB Basic Part: No; JLCPCB Part Number: C2760347; Supplier 1: LCSC; Category: Capacitors - MLCC; Supplier Part Number 1: C2760347; Voltage Rating: 50V; RoHS: Yes; ComponentLink1Description: Datasheet; ComponentLink1URL: https://wmsc.lcsc.com/wmsc/upload/file/pdf/v2/lcsc/2304140030_HUI-JU-NL1206B183K500CPBN_C2760347.pdf; ComponentLink2Description: JLCPCB Part URL; ComponentLink2URL: https://jlcpcb.com/partdetail/C2760347; ComponentLink3Description: LCSC Part URL; ComponentLink3URL: https://lcsc.com/product-detail/Multilayer-Ceramic-Capacitors-MLCC---SMD-SMT_HUI-JU-HUI-JU-NL1206B183K500CPBN_C2760347.html
footprint CAP-1206 (1206 (3216M) Capacitor)
pins: 1, 2

## NL1206B222K500CPBN
designator C?  Capacitance: 2.2nF  (hidden comment: *)
Capacitor, Ceramic (MLCC), 2.2nF, ±10%, 50V, ±10%, SMD 1206; Manufacturer: HUI JU; Manufacturer Part Number: NL1206B222K500CPBN; Package Size: 1206; JLCPCB Basic Part: No; JLCPCB Part Number: C969990; Supplier 1: LCSC; Category: Capacitors - MLCC; Supplier Part Number 1: C969990; Tolerance: ±10%; Voltage Rating: 50V; RoHS: Yes; ComponentLink1Description: Datasheet; ComponentLink1URL: https://wmsc.lcsc.com/wmsc/upload/file/pdf/v2/lcsc/2304140030_HUI-JU-NL1206B222K500CPBN_C969990.pdf; ComponentLink2Description: JLCPCB Part URL; ComponentLink2URL: https://jlcpcb.com/partdetail/C969990; ComponentLink3Description: LCSC Part URL; ComponentLink3URL: https://lcsc.com/product-detail/Multilayer-Ceramic-Capacitors-MLCC---SMD-SMT_HUI-JU-HUI-JU-NL1206B222K500CPBN_C969990.html
footprint CAP-1206 (1206 (3216M) Capacitor)
pins: 1, 2

## NL1206B223K500CPBN
designator C?  Capacitance: 22nF  (hidden comment: *)
Capacitor, Ceramic (MLCC), 22nF, ±10%, 50V, ±10%, SMD 1206; Manufacturer: HUI JU; Manufacturer Part Number: NL1206B223K500CPBN; Package Size: 1206; JLCPCB Basic Part: No; JLCPCB Part Number: C976244; Supplier 1: LCSC; Category: Capacitors - MLCC; Supplier Part Number 1: C976244; Tolerance: ±10%; Voltage Rating: 50V; RoHS: Yes; ComponentLink1Description: Datasheet; ComponentLink1URL: https://wmsc.lcsc.com/wmsc/upload/file/pdf/v2/lcsc/2304140030_HUI-JU-NL1206B223K500CPBN_C976244.pdf; ComponentLink2Description: JLCPCB Part URL; ComponentLink2URL: https://jlcpcb.com/partdetail/C976244; ComponentLink3Description: LCSC Part URL; ComponentLink3URL: https://lcsc.com/product-detail/Multilayer-Ceramic-Capacitors-MLCC---SMD-SMT_HUI-JU-HUI-JU-NL1206B223K500CPBN_C976244.html
footprint CAP-1206 (1206 (3216M) Capacitor)
pins: 1, 2

## NL1206B224K500CEDN
designator C?  Capacitance: 220nF  (hidden comment: *)
Capacitor, Ceramic (MLCC), 220nF, ±10%, 50V, ±10%, SMD 1206; Manufacturer: HUI JU; Manufacturer Part Number: NL1206B224K500CEDN; Package Size: 1206; JLCPCB Basic Part: No; JLCPCB Part Number: C913404; Supplier 1: LCSC; Category: Capacitors - MLCC; Supplier Part Number 1: C913404; Tolerance: ±10%; Voltage Rating: 50V; RoHS: Yes; ComponentLink1Description: Datasheet; ComponentLink1URL: https://wmsc.lcsc.com/wmsc/upload/file/pdf/v2/lcsc/2011031039_HUI-JU-NL1206B224K500CEDN_C913404.pdf; ComponentLink2Description: JLCPCB Part URL; ComponentLink2URL: https://jlcpcb.com/partdetail/C913404; ComponentLink3Description: LCSC Part URL; ComponentLink3URL: https://lcsc.com/product-detail/Multilayer-Ceramic-Capacitors-MLCC---SMD-SMT_HUI-JU-HUI-JU-NL1206B224K500CEDN_C913404.html
footprint CAP-1206 (1206 (3216M) Capacitor)
pins: 1, 2

## NL1206B224K500CPBN
designator C?  Capacitance: 220nF  (hidden comment: *)
Capacitor, Ceramic (MLCC), 220nF, ±10%, 50V, ±10%, SMD 1206; Manufacturer: HUI JU; Manufacturer Part Number: NL1206B224K500CPBN; Package Size: 1206; JLCPCB Basic Part: No; JLCPCB Part Number: C2760332; Supplier 1: LCSC; Category: Capacitors - MLCC; Supplier Part Number 1: C2760332; Tolerance: ±10%; Voltage Rating: 50V; RoHS: Yes; ComponentLink1Description: Datasheet; ComponentLink1URL: https://wmsc.lcsc.com/wmsc/upload/file/pdf/v2/lcsc/2304140030_HUI-JU-NL1206B224K500CPBN_C2760332.pdf; ComponentLink2Description: JLCPCB Part URL; ComponentLink2URL: https://jlcpcb.com/partdetail/C2760332; ComponentLink3Description: LCSC Part URL; ComponentLink3URL: https://lcsc.com/product-detail/Multilayer-Ceramic-Capacitors-MLCC---SMD-SMT_HUI-JU-HUI-JU-NL1206B224K500CPBN_C2760332.html
footprint CAP-1206 (1206 (3216M) Capacitor)
pins: 1, 2

## NL1206B273K500CPBN
designator C?  Capacitance: 27nF  (hidden comment: *)
Capacitor, Ceramic (MLCC), 27nF, ±10%, 50V, ±10%, SMD 1206; Manufacturer: HUI JU; Manufacturer Part Number: NL1206B273K500CPBN; Package Size: 1206; JLCPCB Basic Part: No; JLCPCB Part Number: C2760350; Supplier 1: LCSC; Category: Capacitors - MLCC; Supplier Part Number 1: C2760350; Tolerance: ±10%; Voltage Rating: 50V; RoHS: Yes; ComponentLink1Description: Datasheet; ComponentLink1URL: https://wmsc.lcsc.com/wmsc/upload/file/pdf/v2/lcsc/2304140030_HUI-JU-NL1206B273K500CPBN_C2760350.pdf; ComponentLink2Description: JLCPCB Part URL; ComponentLink2URL: https://jlcpcb.com/partdetail/C2760350; ComponentLink3Description: LCSC Part URL; ComponentLink3URL: https://lcsc.com/product-detail/Multilayer-Ceramic-Capacitors-MLCC---SMD-SMT_HUI-JU-HUI-JU-NL1206B273K500CPBN_C2760350.html
footprint CAP-1206 (1206 (3216M) Capacitor)
pins: 1, 2

## NL1206B333K500CPBN
designator C?  Capacitance: 33nF  (hidden comment: *)
Capacitor, Ceramic (MLCC), 33nF, ±10%, 50V, ±10%, SMD 1206; Manufacturer: HUI JU; Manufacturer Part Number: NL1206B333K500CPBN; Package Size: 1206; JLCPCB Basic Part: No; JLCPCB Part Number: C918137; Supplier 1: LCSC; Category: Capacitors - MLCC; Supplier Part Number 1: C918137; Tolerance: ±10%; Voltage Rating: 50V; RoHS: Yes; ComponentLink1Description: Datasheet; ComponentLink1URL: https://wmsc.lcsc.com/wmsc/upload/file/pdf/v2/lcsc/2304140030_HUI-JU-NL1206B333K500CPBN_C918137.pdf; ComponentLink2Description: JLCPCB Part URL; ComponentLink2URL: https://jlcpcb.com/partdetail/C918137; ComponentLink3Description: LCSC Part URL; ComponentLink3URL: https://lcsc.com/product-detail/Multilayer-Ceramic-Capacitors-MLCC---SMD-SMT_HUI-JU-HUI-JU-NL1206B333K500CPBN_C918137.html
footprint CAP-1206 (1206 (3216M) Capacitor)
pins: 1, 2

## NL1206B334K500CEDN
designator C?  Capacitance: 330nF  (hidden comment: *)
Capacitor, Ceramic (MLCC), 330nF, ±10%, 50V, X7R, ±10%, SMD 1206; Manufacturer: HUI JU; Manufacturer Part Number: NL1206B334K500CEDN; Package Size: 1206; JLCPCB Basic Part: No; JLCPCB Part Number: C710479; Supplier 1: LCSC; Category: Capacitors - MLCC; Supplier Part Number 1: C710479; Tolerance: ±10%; Voltage Rating: 50V; Temperature Coefficient: X7R; RoHS: Yes; ComponentLink1Description: Datasheet; ComponentLink1URL: https://wmsc.lcsc.com/wmsc/upload/file/pdf/v2/lcsc/2304140030_HUI-JU-NL1206B334K500CEDN_C710479.pdf; ComponentLink2Description: JLCPCB Part URL; ComponentLink2URL: https://jlcpcb.com/partdetail/C710479; ComponentLink3Description: LCSC Part URL; ComponentLink3URL: https://lcsc.com/product-detail/Multilayer-Ceramic-Capacitors-MLCC---SMD-SMT_HUI-JU-HUI-JU-NL1206B334K500CEDN_C710479.html
footprint CAP-1206 (1206 (3216M) Capacitor)
pins: 1, 2

## NL1206B334K500CPBN
designator C?  Capacitance: 330nF  (hidden comment: *)
Capacitor, Ceramic (MLCC), 330nF, ±10%, 50V, ±10%, SMD 1206; Manufacturer: HUI JU; Manufacturer Part Number: NL1206B334K500CPBN; Package Size: 1206; JLCPCB Basic Part: No; JLCPCB Part Number: C969993; Supplier 1: LCSC; Category: Capacitors - MLCC; Supplier Part Number 1: C969993; Tolerance: ±10%; Voltage Rating: 50V; RoHS: Yes; ComponentLink1Description: Datasheet; ComponentLink1URL: https://wmsc.lcsc.com/wmsc/upload/file/pdf/v2/lcsc/2304140030_HUI-JU-NL1206B334K500CPBN_C969993.pdf; ComponentLink2Description: JLCPCB Part URL; ComponentLink2URL: https://jlcpcb.com/partdetail/C969993; ComponentLink3Description: LCSC Part URL; ComponentLink3URL: https://lcsc.com/product-detail/Multilayer-Ceramic-Capacitors-MLCC---SMD-SMT_HUI-JU-HUI-JU-NL1206B334K500CPBN_C969993.html
footprint CAP-1206 (1206 (3216M) Capacitor)
pins: 1, 2

## NL1206B393K500CPBN
designator C?  Capacitance: 39nF  (hidden comment: *)
Capacitor, Ceramic (MLCC), 39nF, ±10%, 50V, ±10%, SMD 1206; Manufacturer: HUI JU; Manufacturer Part Number: NL1206B393K500CPBN; Package Size: 1206; JLCPCB Basic Part: No; JLCPCB Part Number: C2760341; Supplier 1: LCSC; Category: Capacitors - MLCC; Supplier Part Number 1: C2760341; Tolerance: ±10%; Voltage Rating: 50V; RoHS: Yes; ComponentLink1Description: Datasheet; ComponentLink1URL: https://wmsc.lcsc.com/wmsc/upload/file/pdf/v2/lcsc/2304140030_HUI-JU-NL1206B393K500CPBN_C2760341.pdf; ComponentLink2Description: JLCPCB Part URL; ComponentLink2URL: https://jlcpcb.com/partdetail/C2760341; ComponentLink3Description: LCSC Part URL; ComponentLink3URL: https://lcsc.com/product-detail/Multilayer-Ceramic-Capacitors-MLCC---SMD-SMT_HUI-JU-HUI-JU-NL1206B393K500CPBN_C2760341.html
footprint CAP-1206 (1206 (3216M) Capacitor)
pins: 1, 2

## NL1206B394K500CEGN
designator C?  Capacitance: 390nF  (hidden comment: *)
Capacitor, Ceramic (MLCC), 390nF, ±10%, 50V, X7R, ±10%, SMD 1206; Manufacturer: HUI JU; Manufacturer Part Number: NL1206B394K500CEGN; Package Size: 1206; JLCPCB Basic Part: No; JLCPCB Part Number: C725801; Supplier 1: LCSC; Category: Capacitors - MLCC; Supplier Part Number 1: C725801; Tolerance: ±10%; Voltage Rating: 50V; Temperature Coefficient: X7R; RoHS: Yes; ComponentLink1Description: Datasheet; ComponentLink1URL: https://wmsc.lcsc.com/wmsc/upload/file/pdf/v2/lcsc/2304140030_HUI-JU-NL1206B394K500CEGN_C725801.pdf; ComponentLink2Description: JLCPCB Part URL; ComponentLink2URL: https://jlcpcb.com/partdetail/C725801; ComponentLink3Description: LCSC Part URL; ComponentLink3URL: https://lcsc.com/product-detail/Multilayer-Ceramic-Capacitors-MLCC---SMD-SMT_HUI-JU-HUI-JU-NL1206B394K500CEGN_C725801.html
footprint CAP-1206 (1206 (3216M) Capacitor)
pins: 1, 2

## NL1206B472K500CPBN
designator C?  Capacitance: 4.7nF  (hidden comment: *)
Capacitor, Ceramic (MLCC), 4.7nF, ±10%, 50V, ±10%, SMD 1206; Manufacturer: HUI JU; Manufacturer Part Number: NL1206B472K500CPBN; Package Size: 1206; JLCPCB Basic Part: No; JLCPCB Part Number: C969991; Supplier 1: LCSC; Category: Capacitors - MLCC; Supplier Part Number 1: C969991; Tolerance: ±10%; Voltage Rating: 50V; RoHS: Yes; ComponentLink1Description: Datasheet; ComponentLink1URL: https://wmsc.lcsc.com/wmsc/upload/file/pdf/v2/lcsc/2304140030_HUI-JU-NL1206B472K500CPBN_C969991.pdf; ComponentLink2Description: JLCPCB Part URL; ComponentLink2URL: https://jlcpcb.com/partdetail/C969991; ComponentLink3Description: LCSC Part URL; ComponentLink3URL: https://lcsc.com/product-detail/Multilayer-Ceramic-Capacitors-MLCC---SMD-SMT_HUI-JU-HUI-JU-NL1206B472K500CPBN_C969991.html
footprint CAP-1206 (1206 (3216M) Capacitor)
pins: 1, 2

## NL1206B473K500CPBN
designator C?  Capacitance: 47nF  (hidden comment: *)
Capacitor, Ceramic (MLCC), 47nF, 50V, SMD 1206; Manufacturer: HUI JU; Manufacturer Part Number: NL1206B473K500CPBN; Package Size: 1206; JLCPCB Basic Part: No; JLCPCB Part Number: C2760336; Supplier 1: LCSC; Category: Capacitors - MLCC; Supplier Part Number 1: C2760336; Voltage Rating: 50V; RoHS: Yes; ComponentLink1Description: Datasheet; ComponentLink1URL: https://wmsc.lcsc.com/wmsc/upload/file/pdf/v2/lcsc/2304140030_HUI-JU-NL1206B473K500CPBN_C2760336.pdf; ComponentLink2Description: JLCPCB Part URL; ComponentLink2URL: https://jlcpcb.com/partdetail/C2760336; ComponentLink3Description: LCSC Part URL; ComponentLink3URL: https://lcsc.com/product-detail/Multilayer-Ceramic-Capacitors-MLCC---SMD-SMT_HUI-JU-HUI-JU-NL1206B473K500CPBN_C2760336.html
footprint CAP-1206 (1206 (3216M) Capacitor)
pins: 1, 2

## NL1206B474K500CEDN
designator C?  Capacitance: 470nF  (hidden comment: *)
Capacitor, Ceramic (MLCC), 470nF, ±10%, 50V, X7R, ±10%, SMD 1206; Manufacturer: HUI JU; Manufacturer Part Number: NL1206B474K500CEDN; Package Size: 1206; JLCPCB Basic Part: No; JLCPCB Part Number: C710481; Supplier 1: LCSC; Category: Capacitors - MLCC; Supplier Part Number 1: C710481; Tolerance: ±10%; Voltage Rating: 50V; Temperature Coefficient: X7R; RoHS: Yes; ComponentLink1Description: Datasheet; ComponentLink1URL: https://wmsc.lcsc.com/wmsc/upload/file/pdf/v2/lcsc/2304140030_HUI-JU-NL1206B474K500CEDN_C710481.pdf; ComponentLink2Description: JLCPCB Part URL; ComponentLink2URL: https://jlcpcb.com/partdetail/C710481; ComponentLink3Description: LCSC Part URL; ComponentLink3URL: https://lcsc.com/product-detail/Multilayer-Ceramic-Capacitors-MLCC---SMD-SMT_HUI-JU-HUI-JU-NL1206B474K500CEDN_C710481.html
footprint CAP-1206 (1206 (3216M) Capacitor)
pins: 1, 2

## NL1206B474K500CEGN
designator C?  Capacitance: 470nF  (hidden comment: *)
Capacitor, Ceramic (MLCC), 470nF, ±10%, 50V, X7R, ±10%, SMD 1206; Manufacturer: HUI JU; Manufacturer Part Number: NL1206B474K500CEGN; Package Size: 1206; JLCPCB Basic Part: No; JLCPCB Part Number: C710482; Supplier 1: LCSC; Category: Capacitors - MLCC; Supplier Part Number 1: C710482; Tolerance: ±10%; Voltage Rating: 50V; Temperature Coefficient: X7R; RoHS: Yes; ComponentLink1Description: Datasheet; ComponentLink1URL: https://wmsc.lcsc.com/wmsc/upload/file/pdf/v2/lcsc/2304140030_HUI-JU-NL1206B474K500CEGN_C710482.pdf; ComponentLink2Description: JLCPCB Part URL; ComponentLink2URL: https://jlcpcb.com/partdetail/C710482; ComponentLink3Description: LCSC Part URL; ComponentLink3URL: https://lcsc.com/product-detail/Multilayer-Ceramic-Capacitors-MLCC---SMD-SMT_HUI-JU-HUI-JU-NL1206B474K500CEGN_C710482.html
footprint CAP-1206 (1206 (3216M) Capacitor)
pins: 1, 2

## NL1206B563K500CEGN
designator C?  Capacitance: 56nF  (hidden comment: *)
Capacitor, Ceramic (MLCC), 56nF, ±10%, 50V, ±10%, SMD 1206; Manufacturer: HUI JU; Manufacturer Part Number: NL1206B563K500CEGN; Package Size: 1206; JLCPCB Basic Part: No; JLCPCB Part Number: C976245; Supplier 1: LCSC; Category: Capacitors - MLCC; Supplier Part Number 1: C976245; Tolerance: ±10%; Voltage Rating: 50V; RoHS: Yes; ComponentLink1Description: Datasheet; ComponentLink1URL: https://wmsc.lcsc.com/wmsc/upload/file/pdf/v2/lcsc/2304140030_HUI-JU-NL1206B563K500CEGN_C976245.pdf; ComponentLink2Description: JLCPCB Part URL; ComponentLink2URL: https://jlcpcb.com/partdetail/C976245; ComponentLink3Description: LCSC Part URL; ComponentLink3URL: https://lcsc.com/product-detail/Multilayer-Ceramic-Capacitors-MLCC---SMD-SMT_HUI-JU-HUI-JU-NL1206B563K500CEGN_C976245.html
footprint CAP-1206 (1206 (3216M) Capacitor)
pins: 1, 2

## NL1206B563K500CPBN
designator C?  Capacitance: 56nF  (hidden comment: *)
Capacitor, Ceramic (MLCC), 56nF, 50V, SMD 1206; Manufacturer: HUI JU; Manufacturer Part Number: NL1206B563K500CPBN; Package Size: 1206; JLCPCB Basic Part: No; JLCPCB Part Number: C2760346; Supplier 1: LCSC; Category: Capacitors - MLCC; Supplier Part Number 1: C2760346; Voltage Rating: 50V; RoHS: Yes; ComponentLink1Description: Datasheet; ComponentLink1URL: https://wmsc.lcsc.com/wmsc/upload/file/pdf/v2/lcsc/2304140030_HUI-JU-NL1206B563K500CPBN_C2760346.pdf; ComponentLink2Description: JLCPCB Part URL; ComponentLink2URL: https://jlcpcb.com/partdetail/C2760346; ComponentLink3Description: LCSC Part URL; ComponentLink3URL: https://lcsc.com/product-detail/Multilayer-Ceramic-Capacitors-MLCC---SMD-SMT_HUI-JU-HUI-JU-NL1206B563K500CPBN_C2760346.html
footprint CAP-1206 (1206 (3216M) Capacitor)
pins: 1, 2

## NL1206B564K500CEGN
designator C?  Capacitance: 560nF  (hidden comment: *)
Capacitor, Ceramic (MLCC), 560nF, 50V, SMD 1206; Manufacturer: HUI JU; Manufacturer Part Number: NL1206B564K500CEGN; Package Size: 1206; JLCPCB Basic Part: No; JLCPCB Part Number: C2835174; Supplier 1: LCSC; Category: Capacitors - MLCC; Supplier Part Number 1: C2835174; Voltage Rating: 50V; RoHS: Yes; ComponentLink1Description: Datasheet; ComponentLink1URL: https://wmsc.lcsc.com/wmsc/upload/file/pdf/v2/lcsc/2304140030_HUI-JU-NL1206B564K500CEGN_C2835174.pdf; ComponentLink2Description: JLCPCB Part URL; ComponentLink2URL: https://jlcpcb.com/partdetail/C2835174; ComponentLink3Description: LCSC Part URL; ComponentLink3URL: https://lcsc.com/product-detail/Multilayer-Ceramic-Capacitors-MLCC---SMD-SMT_HUI-JU-HUI-JU-NL1206B564K500CEGN_C2835174.html
footprint CAP-1206 (1206 (3216M) Capacitor)
pins: 1, 2

## NL1206B682K500CPBN
designator C?  Capacitance: 6.8nF  (hidden comment: *)
Capacitor, Ceramic (MLCC), 6.8nF, 50V, X7R, SMD 1206; Manufacturer: HUI JU; Manufacturer Part Number: NL1206B682K500CPBN; Package Size: 1206; JLCPCB Basic Part: No; JLCPCB Part Number: C2961029; Supplier 1: LCSC; Category: Capacitors - MLCC; Supplier Part Number 1: C2961029; Voltage Rating: 50V; Temperature Coefficient: X7R; RoHS: Yes; ComponentLink1Description: Datasheet; ComponentLink1URL: https://wmsc.lcsc.com/wmsc/upload/file/pdf/v2/lcsc/2201141700_HUI-JU-NL1206B682K500CPBN_C2961029.pdf; ComponentLink2Description: JLCPCB Part URL; ComponentLink2URL: https://jlcpcb.com/partdetail/C2961029; ComponentLink3Description: LCSC Part URL; ComponentLink3URL: https://lcsc.com/product-detail/Multilayer-Ceramic-Capacitors-MLCC---SMD-SMT_HUI-JU-HUI-JU-NL1206B682K500CPBN_C2961029.html
footprint CAP-1206 (1206 (3216M) Capacitor)
pins: 1, 2

## NL1206B683K500CPBN
designator C?  Capacitance: 68nF  (hidden comment: *)
Capacitor, Ceramic (MLCC), 68nF, ±10%, 50V, ±10%, SMD 1206; Manufacturer: HUI JU; Manufacturer Part Number: NL1206B683K500CPBN; Package Size: 1206; JLCPCB Basic Part: No; JLCPCB Part Number: C976246; Supplier 1: LCSC; Category: Capacitors - MLCC; Supplier Part Number 1: C976246; Tolerance: ±10%; Voltage Rating: 50V; RoHS: Yes; ComponentLink1Description: Datasheet; ComponentLink1URL: https://wmsc.lcsc.com/wmsc/upload/file/pdf/v2/lcsc/2304140030_HUI-JU-NL1206B683K500CPBN_C976246.pdf; ComponentLink2Description: JLCPCB Part URL; ComponentLink2URL: https://jlcpcb.com/partdetail/C976246; ComponentLink3Description: LCSC Part URL; ComponentLink3URL: https://lcsc.com/product-detail/Multilayer-Ceramic-Capacitors-MLCC---SMD-SMT_HUI-JU-HUI-JU-NL1206B683K500CPBN_C976246.html
footprint CAP-1206 (1206 (3216M) Capacitor)
pins: 1, 2
